# Altium footprint library Project_Vega.PcbLib: 50 footprints (part 3 of 4)
Each footprint in its own frame and in the unit in brackets; x right, y up, seen from the top. Pads: shape width x height; smd on the part's side, far side on the other; paste and mask are expansions set on the pad; w line width, h text height; cw(c..) or ccw(c..) is an arc to the next point about the centre after c.
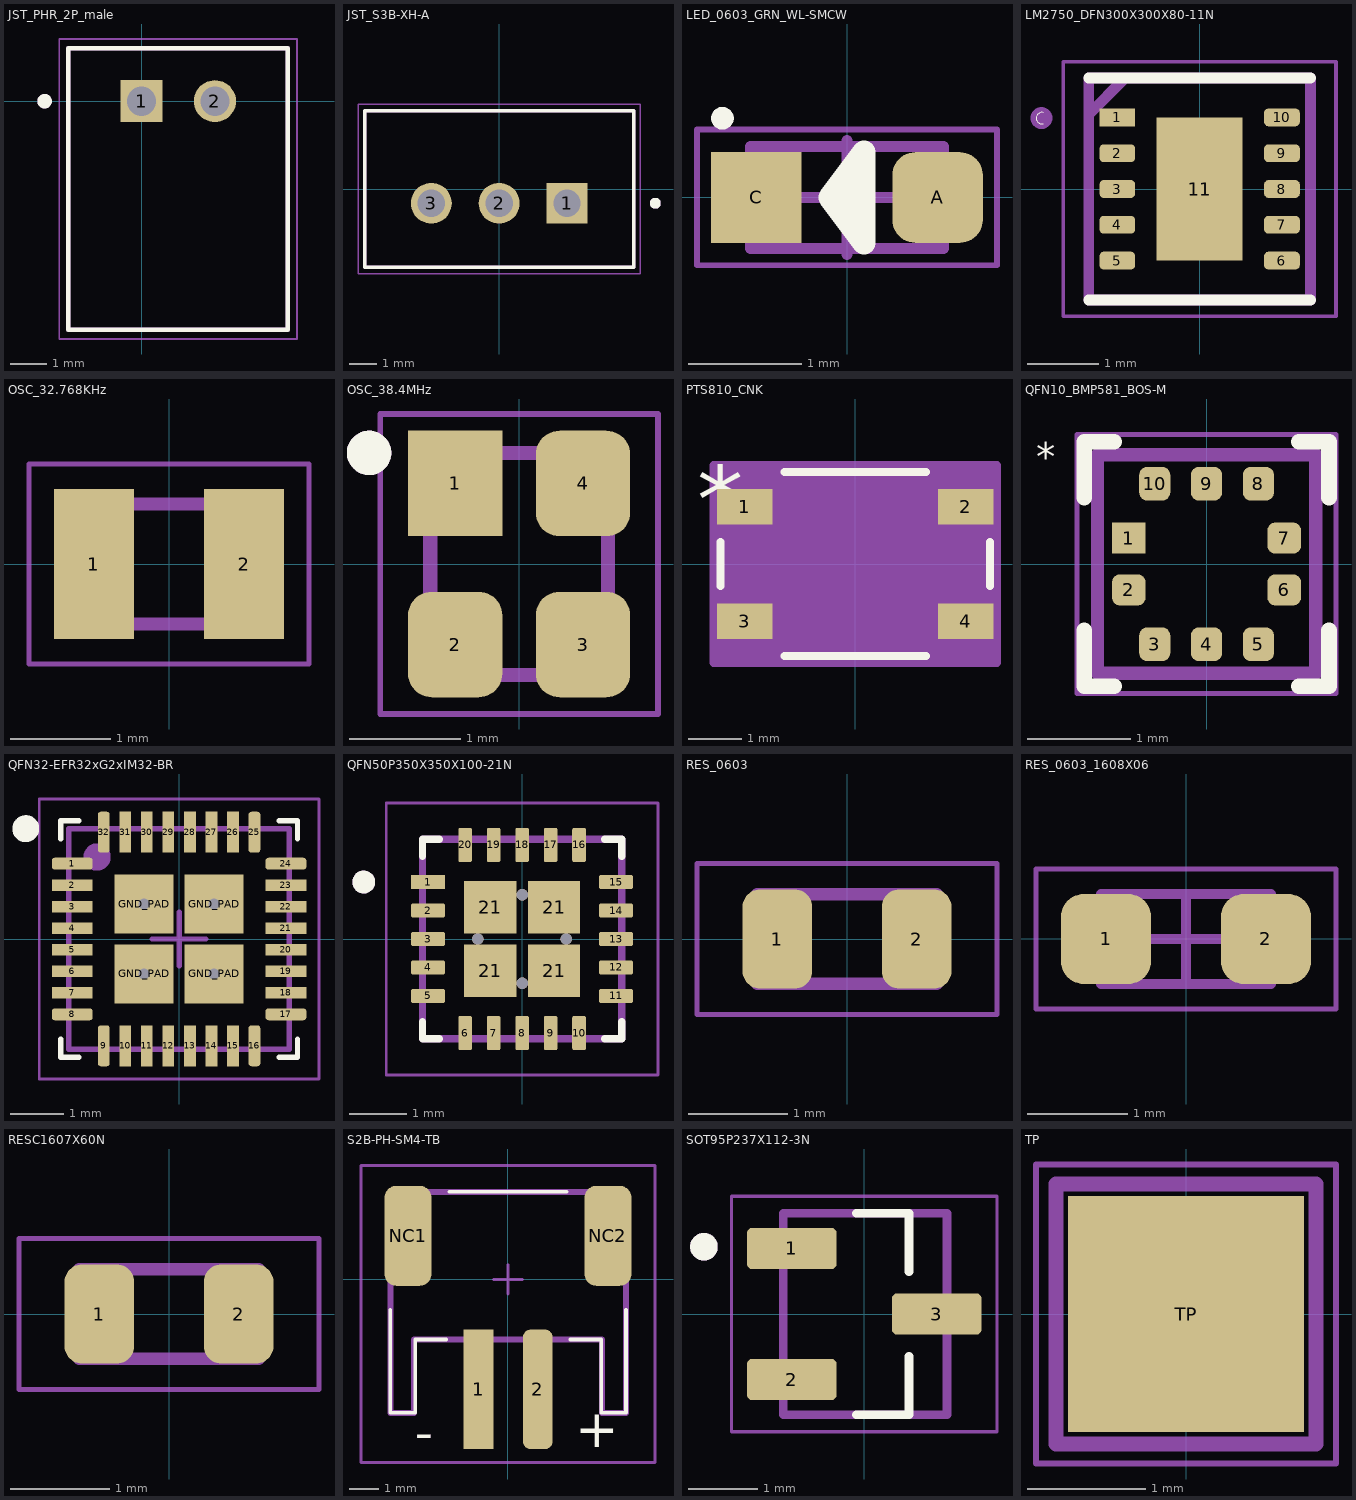
[diagram p2: the footprints below, top view; thin cyan lines are the x and y axes]

## JST_PHR_2P_male [mm]
height 5.25
pads (2):
  rect 1.15x1.15 / inner round 1.15 / far side rect 1.15x1.15 hole 0.8: 1(0,0)
  round 1.15 hole 0.8: 2(2.007,0)
Top Overlay:
  circle w0.2: c-2.65,0 r0.1
  lines w0.127: -2,-6.25 4,-6.25 4,1.45 -2,1.45 -2,-6.25
Mechanical 13:
  circle w0.2: c-2.65,0 r0.1
  lines w0.127: -2,-6.25 4,-6.25 4,1.45 -2,1.45 -2,-6.25
  text ".Designator" at 0.076,-2.794 h0.76
Mechanical 15:
  lines w0.05: -2.25,-6.5 4.25,-6.5 4.25,1.7 -2.25,1.7 -2.25,-6.5
3D body "440055-2.stp": height 4.96, standoff -3.39, extent -1.936,-6.223 4.064,1.477

## JST_S3B-XH-A [mm]
height 7
pads (3):
  rect 1.508x1.508 / inner round 1.508 / far side rect 1.508x1.508 hole 1: 1(2.5,-0.525)
  round 1.508 hole 1: 2(0,-0.525) 3(-2.5,-0.525)
Top Overlay:
  circle w0.2: c5.75,-0.525 r0.1
  lines w0.127: -4.95,-2.875 4.95,-2.875 4.95,2.875 -4.95,2.875 -4.95,-2.875
Mechanical 1:
  text ".Designator" at -0.762,0.762 h1.52
Mechanical 13:
  circle w0.2: c5.75,-0.525 r0.1
  lines w0.127: -4.95,-2.875 4.95,-2.875 4.95,2.875 -4.95,2.875 -4.95,-2.875
Mechanical 15:
  lines w0.05: -5.2,-3.125 5.2,-3.125 5.2,3.125 -5.2,3.125 -5.2,-3.125
3D body "S3B-XH-A.STEP": height 6.1, standoff -3.4, extent -4.95,-2.92 4.95,8.58

## LED_0603_GRN_WL-SMCW [mm] "SODFL, 2-Leads, Body 0.80x1.80mm, IPC Medium Density"
height 0.8
pads (2):
  rrect50% 0.8x0.8 smd: A(0.8,0)
  rect 0.8x0.8 smd: C(-0.8,0)
Top Overlay:
  circle w0.1: c-1.1,0.7 r0.05
  lines w0.2: -0.15,0 0.05,0
  lines w0.205: -0.15,0 0.15,-0.4 0.15,0.4 -0.15,0
Mechanical 13:
  lines w0.1: -0.85,-0.45 -0.85,0.45 0.85,0.45 0.85,-0.45 -0.85,-0.45
  text ".Designator" at -0.723,-0.254 h0.5
Mechanical 15:
  lines w0.05: -1.325,-0.6 -1.325,0.6 1.325,0.6 1.325,-0.6 -1.325,-0.6
  lines w0.1: -0.5,0 0.5,0 ; 0,-0.5 0,0.5
3D body "LED_0603_WURTH_WL-SMCW_lens.step": height 0.71, standoff 0.31, extent -0.55,-0.4 0.55,0.4
3D body "LED_0603_WURTH_WL-SMCW_base.step": height 0.65, standoff 0.01, extent -0.8,-0.4 0.8,0.4

## LM2750_DFN300X300X80-11N [mm]
pads (11):
  rect 0.5x0.25 smd: 1(-1.15,1)
  rrect50% 0.5x0.25 smd: 2(-1.15,0.5) 3(-1.15,0) 4(-1.15,-0.5) 5(-1.15,-1) 6(1.15,-1) 7(1.15,-0.5) 8(1.15,0) 9(1.15,0.5) 10(1.15,1)
  rect 1.2x2 smd: 11(0,0)
Top Overlay:
  lines w0: -2.184,0.914 cw(c-2.203,0.991) -2.184,1.067
  lines w0.152: -1.549,-1.549 1.549,-1.549 ; -1.549,1.549 1.549,1.549
Mechanical 13:
  lines w0.152: -1.549,1.041 -1.041,1.549 ; -2.286,0.991 cw(c-2.21,0.991) -2.134,0.991 cw(c-2.21,0.991) -2.286,0.991 ; -1.549,-1.549 -1.549,1.549 1.549,1.549 1.549,-1.549 -1.549,-1.549
  text ".Designator" at -0.025,0.017 h0.51
Mechanical 15:
  lines w0.05: -1.905,-1.778 -1.905,1.778 1.905,1.778 1.905,-1.778 -1.905,-1.778
3D body "LM2750SD-5.0_NOPB.STEP": height 0.8, standoff 0, extent -1.5,-1.5 1.5,1.5

## OSC_32.768KHz [mm] "Tuning Fork Crystal 32.768kHz in 1.2 x 2.0mm package"
height 0.6
pads (2):
  rect 0.8x1.5 smd: 1(-0.75,0) 2(0.75,0)
Mechanical 13:
  lines w0.127: -1,-0.6 1,-0.6 1,0.6 -1,0.6 -1,-0.6
  text ".Designator" at -0.127,-0.136 h0.51
Mechanical 15:
  lines w0.05: -1.4,-1 1.4,-1 1.4,1 -1.4,1 -1.4,-1
3D body "step_temp.STEP": height 0.6, standoff 0, extent -1,-0.6 1,0.6

## OSC_38.4MHz [mm] "38.4 MHz ±10ppm Crystal 10pF 40 Ohms 4-SMD, No Lead"
height 0.7
pads (4):
  rect 0.85x0.95 smd: 1(-0.575,0.725)
  rrect50% 0.85x0.95 smd: 2(-0.575,-0.725) 3(0.575,-0.725) 4(0.575,0.725)
Top Overlay:
  circle w0.2: c-1.35,1 r0.1
Mechanical 13:
  circle w0.2: c-1.35,1 r0.1
  lines w0.127: -0.8,-1 0.8,-1 0.8,1 -0.8,1 -0.8,-1
  text ".Designator" at 1.024,-0.027 h0.51
Mechanical 15:
  lines w0.05: -1.25,-1.35 1.25,-1.35 1.25,1.35 -1.25,1.35 -1.25,-1.35
3D body "XRCGB38M400F2P00R0.STEP": height 0.7, standoff 0, extent -0.796,-0.995 0.804,1.005

## PTS810_CNK [mm]
pads (4):
  rect 1.041x0.66 smd paste+0 mask+0: 1(-2.075,1.075) 2(2.075,1.075) 3(-2.075,-1.075) 4(2.075,-1.075)
Top Overlay:
  lines w0.152: -2.527,-0.412 -2.527,0.412 ; -1.327,-1.727 1.327,-1.727 ; -1.327,1.727 1.327,1.727 ; 2.527,-0.412 2.527,0.412
  text "*" at -2.972,0.584 h1.27
Mechanical 13:
  lines w0.025: -2.4,-0.8 -2.4,0.8 -1.2,1.6 1.2,1.6 2.4,0.8 2.4,-0.8 1.2,-1.6 -1.2,-1.6 -2.4,-0.8
  text "*" at -1.829,-0.178 h1.27
  text ".Designator" at -1.17,-0.666 h0.75
Mechanical 15:
  region: 2.659,-1.854 -2.659,-1.854 -2.659,1.854 2.659,1.854
  lines w0.152: -2.659,-1.854 -2.659,1.854 2.659,1.854 2.659,-1.854 -2.659,-1.854

## QFN10_BMP581_BOS-M [mm]
pads (10):
  rect 0.325x0.3 smd paste+0 mask+0.05: 1(-0.75,0.25)
  rrect50% 0.325x0.3 smd paste+0 mask+0.05: 2(-0.75,-0.25) 6(0.75,-0.25) 7(0.75,0.25)
  rrect50% 0.3x0.325 smd paste+0 mask+0.05: 3(-0.5,-0.775) 4(0,-0.775) 5(0.5,-0.775) 8(0.5,0.775) 9(0,0.775) 10(-0.5,0.775)
Top Overlay:
  lines w0.152: -1.181,-0.643 -1.181,-1.181 -0.893,-1.181 ; -1.181,0.643 -1.181,1.181 -0.893,1.181 ; 0.893,-1.181 1.181,-1.181 1.181,-0.643 ; 0.893,1.181 1.181,1.181 1.181,0.643
  text "*" at -1.646,0.903 h0.27
Mechanical 13:
  lines w0.127: -1.054,-1.054 1.054,-1.054 1.054,1.054 -1.054,1.054 -1.054,-1.054
  text ".Designator" at -0.229,-0.136 h0.51
Mechanical 15:
  lines w0.05: -1.25,-1.25 -1.25,1.25 1.25,1.25 1.25,-1.25 -1.25,-1.25
3D body "QFN10_BMP581_BOS.step": height 0.81, standoff 0, extent -1.054,-1.054 1.054,1.054

## QFN32-EFR32xG2xIM32-BR [mm] "QFN, 32-Leads, Body 4.00x4.00mm, Pitch 0.40mm, Thermal Pad 2.80x2.80mm, IPC Medium Density"
height 0.9
pads (36):
  rrect50% 0.76x0.22 smd mask+0.06: 1(-1.985,1.4) 8(-1.985,-1.4) 17(1.985,-1.4) 24(1.985,1.4)
  rect 0.76x0.22 smd mask+0.06: 2(-1.985,1) 3(-1.985,0.6) 4(-1.985,0.2) 5(-1.985,-0.2) 6(-1.985,-0.6) 7(-1.985,-1) 18(1.985,-1) 19(1.985,-0.6) 20(1.985,-0.2) 21(1.985,0.2) 22(1.985,0.6) 23(1.985,1)
  rrect50% 0.22x0.76 smd mask+0.06: 9(-1.4,-1.985) 16(1.4,-1.985) 25(1.4,1.985) 32(-1.4,1.985)
  rect 0.22x0.76 smd mask+0.06: 10(-1,-1.985) 11(-0.6,-1.985) 12(-0.2,-1.985) 13(0.2,-1.985) 14(0.6,-1.985) 15(1,-1.985) 26(1,1.985) 27(0.6,1.985) 28(0.2,1.985) 29(-0.2,1.985) 30(-0.6,1.985) 31(-1,1.985)
  rect 1.1x1.1 smd mask+0.06: GND_PAD(-0.65,-0.65) GND_PAD(-0.65,0.65) GND_PAD(0.65,-0.65) GND_PAD(0.65,0.65)
via -0.65,-0.65 diameter 0.5 hole 0.2
via 0.65,-0.65 diameter 0.5 hole 0.2
via 0.65,0.65 diameter 0.5 hole 0.2
via -0.65,0.65 diameter 0.5 hole 0.2
Top Overlay:
  circle w0.25: c-2.85,2.05 r0.125
  lines w0.1: -2.2,-1.86 -2.2,-2.2 -1.86,-2.2 ; -2.2,1.86 -2.2,2.2 -1.86,2.2 ; 1.86,-2.2 2.2,-2.2 2.2,-1.86 ; 1.86,2.2 2.2,2.2 2.2,1.86
Mechanical 13:
  circle w0.254: c-1.524,1.524 r0.127
  lines w0.1: -2.05,-2.05 2.05,-2.05 2.05,2.05 -2.05,2.05 -2.05,-2.05
  text ".Designator" at -1.785,-1.568 h0.65
Mechanical 15:
  lines w0.05: -2.6,-2.6 2.6,-2.6 2.6,2.6 -2.6,2.6 -2.6,-2.6
  lines w0.1: -0.5,0 0.5,0 ; 0,-0.5 0,0.5
3D body "QFN32-EFR32BG21A010F1024IM32-BR.step": height 0.9, standoff 0, extent -2.051,-2.051 2.051,2.051

## QFN50P350X350X100-21N [mm]
pads (24):
  rect 0.6x0.24 smd mask+0.07: 1(-1.65,1)
  rrect25% 0.6x0.24 smd mask+0.07: 2(-1.65,0.5) 3(-1.65,0) 4(-1.65,-0.5) 5(-1.65,-1) 11(1.65,-1) 12(1.65,-0.5) 13(1.65,0) 14(1.65,0.5) 15(1.65,1)
  rrect25% 0.24x0.6 smd mask+0.07: 6(-1,-1.65) 7(-0.5,-1.65) 8(0,-1.65) 9(0.5,-1.65) 10(1,-1.65) 16(1,1.65) 17(0.5,1.65) 18(0,1.65) 19(-0.5,1.65) 20(-1,1.65)
  rect 0.92x0.92 smd paste-0.375 mask+0.07: 21(-0.56,-0.56) 21(-0.56,0.56) 21(0.56,-0.56) 21(0.56,0.56)
via 0,-0.775 diameter 0.2 hole 0.2
via 0.775,0 diameter 0.2 hole 0.2
via 0,0.775 diameter 0.2 hole 0.2
via -0.775,0 diameter 0.2 hole 0.2
Top Overlay:
  circle w0.2: c-2.78,1 r0.1
  lines w0.127: -1.75,-1.45 -1.75,-1.75 -1.45,-1.75 ; -1.75,1.45 -1.75,1.75 -1.45,1.75 ; 1.45,-1.75 1.75,-1.75 1.75,-1.45 ; 1.45,1.75 1.75,1.75 1.75,1.45
Mechanical 13:
  circle w0.2: c-2.78,1 r0.1
  lines w0.127: -1.75,-1.75 -1.75,1.75 1.75,1.75 1.75,-1.75 -1.75,-1.75
  text ".Designator" at -1.018,2.143 h0.51
Mechanical 15:
  lines w0.05: -2.385,-2.385 -2.385,2.385 2.385,2.385 2.385,-2.385 -2.385,-2.385
3D body "step_temp.STEP": height 1, standoff 0, extent -1.75,-1.75 1.75,1.75

## RES_0603 [mm] "Thick film general purpose resistor 0603"
pads (2):
  rrect50% 0.7x1 smd: 1(-0.7,0) 2(0.7,0)
Mechanical 13:
  lines w0.127: -0.9,-0.45 -0.9,0.45 0.9,0.45 0.9,-0.45 -0.9,-0.45
  text ".Designator" at 0.102,-0.179 h0.51
Mechanical 15:
  lines w0.05: -1.508,-0.761 -1.508,0.761 1.508,0.761 1.508,-0.761 -1.508,-0.761
3D body "RC0603JR-070RL--3DModel-STEP-510211.STEP": height 0.55, standoff 0, extent -0.8,-0.4 0.8,0.4

## RES_0603_1608X06 [mm] "Chip Resistor, 2-Leads, Body 1.60x0.80mm, IPC Medium Density"
height 0.55
pads (2):
  rrect50% 0.9x0.9 smd: 1(-0.8,0) 2(0.8,0)
Mechanical 13:
  lines w0.1: -0.85,-0.45 0.85,-0.45 0.85,0.45 -0.85,0.45 -0.85,-0.45
  text ".Designator" at -0.635,-0.254 h0.4
Mechanical 15:
  lines w0.05: -1.5,-0.7 1.5,-0.7 1.5,0.7 -1.5,0.7 -1.5,-0.7
  lines w0.1: -0.45,0 0.45,0 ; 0,-0.45 0,0.45
3D body "0603_1608X05N.step": height 0.45, standoff 0, extent -0.775,-0.425 0.775,0.425

## RESC1607X60N [mm]
pads (2):
  rrect50% 0.7x1 smd: 1(-0.7,0) 2(0.7,0)
Mechanical 13:
  lines w0.127: -0.9,-0.45 0.9,-0.45 0.9,0.45 -0.9,0.45 -0.9,-0.45
  text ".Designator" at -0.755,-0.294 h0.15
Mechanical 15:
  lines w0.05: -1.508,-0.761 1.508,-0.761 1.508,0.761 -1.508,0.761 -1.508,-0.761
3D body "RC0603JR-070RL--3DModel-STEP-510211.STEP": height 0.55, standoff 0, extent -0.8,-0.4 0.8,0.4

## S2B-PH-SM4-TB [mil]
pads (4):
  rect 40x160 smd: 1(-39.44,-147.2)
  rrect50% 40x160 smd: 2(39.93,-147.2)
  rrect50% 63x134 smd: NC1(-133.93,58.46) NC2(133.93,58.46)
Top Overlay:
  lines w5: -157.55,-40.43 -157.55,-178.7 -124.09,-178.7 -124.09,-80.28 -82.68,-80.28 ; -78.74,117.46 78.74,117.46 ; 83.52,-80.28 124.93,-80.28 124.93,-178.7 157.93,-178.7 157.93,-40.43
  text "+" at 89.93,-241.54 h86.8
  text "-" at -125,-245 h86.8
Mechanical 13:
  lines w8: -157.55,-178.7 -157.55,117.46 157.93,117.46 157.93,-178.7 125.93,-178.7 125.93,-80.28 -126.06,-80.28 -126.06,-178.7 -157.55,-178.7
  text ".Designator" at -115,-10 h66.93
Mechanical 15:
  lines w3.94: -19.69,0 19.68,0 ; 0,-19.68 0,19.69 ; -196.85,-245 196.85,-245 196.85,152.48 -196.85,152.48 -196.85,-245
3D body "S2B-PH-SM4-TB.STEP": height 219.54, standoff -0.94, extent -156.09,-215.83 154.93,122.76

## SOT95P237X112-3N [mm]
height 1.12
pads (3):
  rrect25% 1.3x0.6 smd: 1(-1.05,0.95) 2(-1.05,-0.95) 3(1.05,0)
Top Overlay:
  circle w0.2: c-2.325,0.975 r0.1
  lines w0.127: -0.115,-1.46 0.65,-1.46 0.65,-0.615 ; -0.115,1.46 0.65,1.46 0.65,0.615
Mechanical 1:
  text ".Designator" at -0.838,-0.161 h0.51
Mechanical 13:
  circle w0.2: c-2.325,0.975 r0.1
  lines w0.127: -1.175,-1.46 -1.175,1.46 1.2,1.46 1.2,-1.46 -1.175,-1.46
Mechanical 15:
  lines w0.05: -1.925,-1.71 1.925,-1.71 1.925,1.71 -1.925,1.71 -1.925,-1.71
3D body "TMAG5231A2DQDBZR.STEP": height 1.12, standoff 0, extent -1.185,-1.46 1.185,1.46

## TP [mm] "Test point"
pads (1):
  rect 2x2 smd: TP(0,0)
Mechanical 13:
  lines w0.127: -1.1,-1.1 1.1,-1.1 1.1,1.1 -1.1,1.1 -1.1,-1.1
Mechanical 15:
  lines w0.05: -1.27,-1.265 1.27,-1.265 1.27,1.265 -1.27,1.265 -1.27,-1.265